# Altium footprint library Hydra_Ref_pcb.PcbLib: 353 footprints (part 3 of 23)
Each footprint in its own frame and in the unit in brackets; x right, y up, seen from the top. Pads: shape width x height; smd on the part's side, far side on the other; paste and mask are expansions set on the pad; w line width, h text height; cw(c..) or ccw(c..) is an arc to the next point about the centre after c.
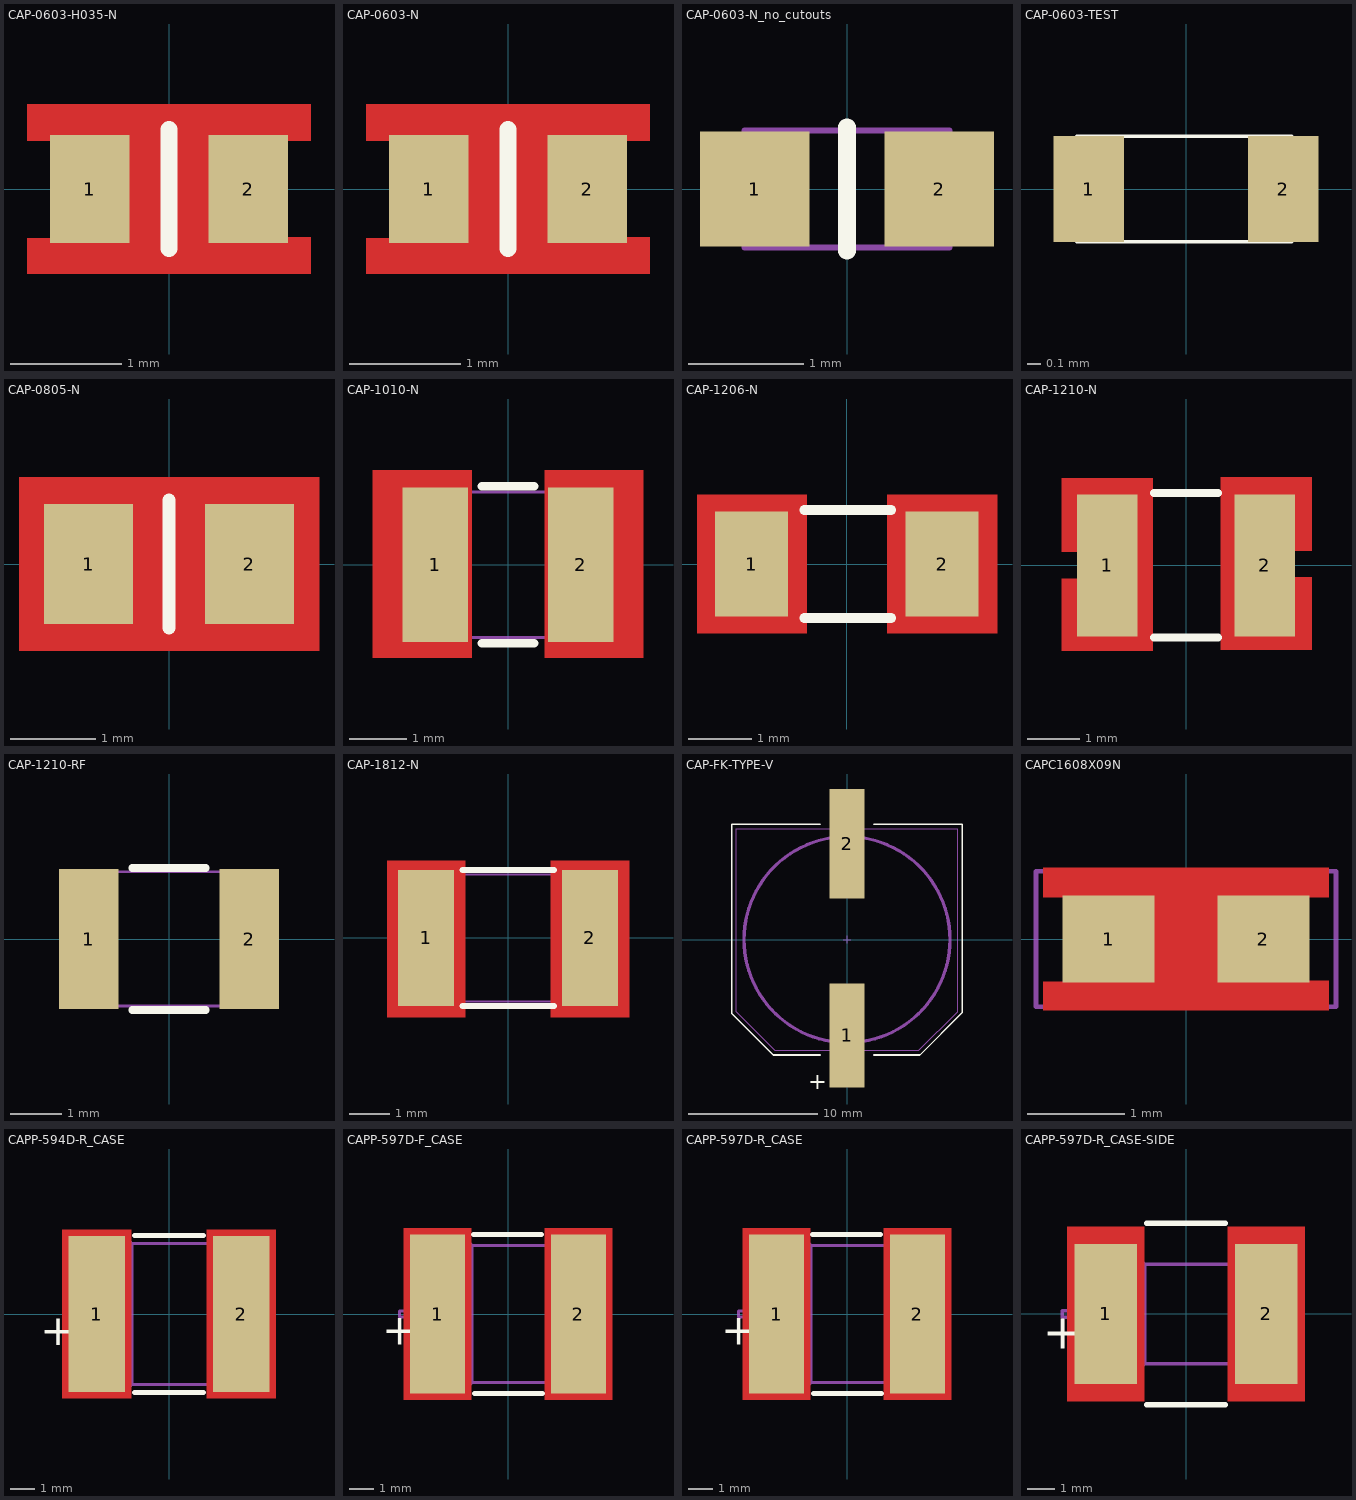
[diagram p2: the footprints below, top view; thin cyan lines are the x and y axes]

## CAP-0603-H035-N [mil] "Metric 1608"
height 35
pads (2):
  rect 28x38 smd: 1(-28,0) 2(28,0)
Top Layer:
  pour cut-out: -50,30 50,30 50,17 42,17 42,-17 50,-17 50,-30 -50,-30 -50,-17.33 -42,-17.33 -42,17 -50,17
Top Overlay:
  lines w6: 0,-21 0,21
Top Solder:
  pour cut-out: -53,30 53,30 53,-30 -53,-30
9 Top Assy:
  lines w2: -34,-19 34,-19 34,19 -34,19 -34,-19
  text ".Designator" at -25,-10 h16
3D body: height 35.43, standoff 0, extent 19.68,-17.72 33.46,17.72
3D body: height 35.43, standoff 0, extent -33.46,-17.72 -19.69,17.72
3D body: height 35.43, standoff 0, extent -19.69,-17.72 19.68,17.72

## CAP-0603-N [mil] "Metric 1608"
height 65
pads (2):
  rect 28x38 smd: 1(-28,0) 2(28,0)
Top Layer:
  pour cut-out: -50,30 50,30 50,17 42,17 42,-17 50,-17 50,-30 -50,-30 -50,-17.33 -42,-17.33 -42,17 -50,17
Top Overlay:
  lines w6: 0,-21 0,21
Top Solder:
  pour cut-out: -53,30 53,30 53,-30 -53,-30
9 Top Assy:
  lines w2: -34,-19 -34,19 34,19 34,-19 -34,-19
  text ".Designator" at -25,-10 h16
3D body: height 38, standoff 0.39, extent -32,-17 32,17

## CAP-0603-N_no_cutouts [mm] "Metric 1608"
height 1.651
pads (2):
  rect 0.95x1 smd: 1(-0.8,0) 2(0.8,0)
Top Overlay:
  lines w0.152: 0,-0.533 0,0.533
9 Top Assy:
  lines w0.051: -0.889,-0.508 -0.889,0.508 0.889,0.508 0.889,-0.508 -0.889,-0.508
  text ".Designator" at -0.635,-0.254 h0.41
3D body: height 1.65, standoff 0, extent -0.888,-0.507 0.888,0.507

## CAP-0603-TEST [mil]
pads (2):
  rect 20x30 smd: 1(-27.5,0) 2(27.5,0)
Top Overlay:
  lines w1: -31,-15 30,-15 30,15 -31,15 -31,-15

## CAP-0805-N [mil] "METRIC 2013"
height 57.09
pads (2):
  rect 41x55 smd: 1(-37,0) 2(37,0)
Top Layer:
  pour cut-out: -69,40 69,40 69,-40 -69,-40
Top Overlay:
  lines w6: 0,-29.53 0,29.53
9 Top Assy:
  lines w2: -42,-27 -42,27 42,27 42,-27 -42,-27
  text ".Designator" at -35,-10 h20
3D body: height 57.09, standoff 0, extent -42,-27 42,27

## CAP-1010-N [mm] "METRIC 3225"
height 1.016
pads (2):
  rect 1.15x2.7 smd: 1(-1.27,0) 2(1.27,0)
Top Layer:
  pour cut-out: 0.638,1.651 2.365,1.651 2.365,-1.626 0.638,-1.626
  pour cut-out: -2.362,1.651 -0.635,1.651 -0.635,-1.626 -2.362,-1.626
Top Overlay:
  lines w0.152: -0.457,-1.372 0.457,-1.372 ; -0.457,1.372 0.457,1.372
9 Top Assy:
  lines w0.051: -1.27,-1.27 1.27,-1.27 1.27,1.27 -1.27,1.27 -1.27,-1.27
  text ".Designator" at -0.889,-0.254 h0.51
3D body: height 1.02, standoff 0.01, extent -1.27,-1.27 1.27,1.27

## CAP-1206-N [mm] "METRIC 3225"
height 1.7
pads (2):
  rect 1.15x1.65 smd: 1(-1.5,0) 2(1.5,0)
Top Layer:
  pour cut-out: -2.362,1.092 -0.635,1.092 -0.635,-1.092 -2.362,-1.092
  pour cut-out: 0.638,1.092 2.365,1.092 2.365,-1.092 0.638,-1.092
Top Overlay:
  lines w0.152: -0.67,-0.85 0.7,-0.85 ; -0.67,0.85 0.7,0.85
9 Top Assy:
  lines w0.051: -1.7,-0.8 -1.7,0.8 1.7,0.8 1.7,-0.8 -1.7,-0.8
  text ".Designator" at -1.5,-0.4 h0.85
3D body: height 1.7, standoff 0, extent -1.699,-0.799 1.699,0.799

## CAP-1210-N [mm] "METRIC 3225"
height 2.79
pads (2):
  rect 1.15x2.7 smd: 1(-1.5,0) 2(1.5,0)
Top Layer:
  pour cut-out: 2.386,1.676 0.659,1.676 0.659,-1.6 2.386,-1.6 2.386,-0.229 2.031,-0.229 2.031,0.279 2.386,0.279
  pour cut-out: -2.362,1.651 -0.635,1.651 -0.635,-1.626 -2.362,-1.626 -2.362,-0.254 -2.007,-0.254 -2.007,0.254 -2.362,0.254
Top Overlay:
  lines w0.152: -0.61,-1.372 0.61,-1.372 ; -0.61,1.372 0.61,1.372
9 Top Assy:
  lines w0.051: -1.7,-1.35 -1.7,1.35 1.7,1.35 1.7,-1.35 -1.7,-1.35
  text ".Designator" at -1.5,-0.4 h0.81
3D body: height 2.8, standoff 0.01, extent -1.7,-1.35 1.7,1.35

## CAP-1210-RF [mm]
height 2.8
pads (2):
  rect 1.15x2.7 smd: 1(-1.549,0) 2(1.549,0)
Top Overlay:
  lines w0.152: -0.711,-1.372 0.711,-1.372 ; -0.711,1.372 0.711,1.372
9 Top Assy:
  lines w0.051: -1.7,-1.295 -1.7,1.3 1.7,1.3 1.7,-1.295 -1.7,-1.295
  text ".Designator" at -1.55,-0.4 h0.89
3D body: height 2.8, standoff 0, extent -1.699,-1.295 1.7,1.3

## CAP-1812-N [mm] "METRIC 4532"
height 2.7
pads (2):
  rect 1.4x3.4 smd: 1(-2.05,0) 2(2.04,0)
Top Layer:
  pour cut-out: 1.067,1.93 3.023,1.93 3.023,-1.981 1.067,-1.981
  pour cut-out: -3.023,1.93 -1.067,1.93 -1.067,-1.981 -3.023,-1.981
Top Overlay:
  lines w0.152: -1.143,-1.7 1.143,-1.7 ; -1.143,1.7 1.143,1.7
9 Top Assy:
  lines w0.051: -2.54,-1.587 -2.54,1.587 2.54,1.587 2.54,-1.587 -2.54,-1.587
  text ".Designator" at -2.286,-0.635 h1.27
3D body: height 2.7, standoff 0, extent -2.539,-1.587 2.539,1.587

## CAP-FK-TYPE-V [mm] "CAP-FK-TYPE-V"
height 17
pads (2):
  rect 2.7x8.1 smd: 1(0,-7.45)
  rect 2.7x8.5 smd: 2(0,7.45)
Top Overlay:
  lines w0.127: -2.083,-8.966 -5.74,-8.966 -8.941,-5.766 -8.941,8.966 -2.083,8.966 ; 2.083,-8.966 5.664,-8.966 8.941,-5.69 8.941,8.966 ; 2.083,8.966 8.915,8.966
  text "+" at -2.997,-11.608 h1.27
9 Top Assy:
  circle w0.254: c0,0 r8
  lines w0.051: -8.6,8.6 -8.6,-5.624 -5.613,-8.611 5.588,-8.611 8.593,-5.606 ; -8.585,8.6 8.6,8.6 8.6,-5.606
  lines w0.076: -0.3,0 0.3,0 ; 0,-0.3 0,0.3
  text ".Designator" at -2.134,-0.483 h1
  text "+" at -2.997,-10.541 h1.27
3D body: height 2.54, standoff 0, extent -8.6,-8.611 8.6,8.6
3D body: height 16.5, standoff 0.1, extent -8.001,-8.001 7.976,8.001

## CAPC1608X09N [mm] "Chip Capacitor, 2-Leads, Body 1.60x0.80mm, IPC Medium Density"
height 0.9
pads (2):
  rect 0.95x0.9 smd: 1(-0.8,0) 2(0.8,0)
Top Layer:
  pour cut-out: -1.473,0.737 1.473,0.737 1.473,0.432 1.27,0.432 1.27,-0.432 1.473,-0.432 1.473,-0.737 -1.473,-0.737 -1.473,-0.44 -1.27,-0.44 -1.27,0.432 -1.473,0.432
9 Top Assy:
  lines w0.051: -0.85,-0.45 -0.85,0.45 0.85,0.45 0.85,-0.45 -0.85,-0.45
  text ".Designator" at -0.711,-0.178 h0.38
15 Top Optical Placement:
  lines w0.051: -1.55,-0.7 -1.55,0.7 1.55,0.7 1.55,-0.7 -1.55,-0.7
  lines w0.1: -0.45,0 0.45,0 ; 0,-0.45 0,0.45
3D body: height 0.9, standoff 0, extent -0.5,-0.45 0.5,0.45
3D body: height 0.9, standoff 0, extent -0.85,-0.45 -0.5,0.45
3D body: height 0.9, standoff 0, extent 0.5,-0.45 0.85,0.45

## CAPP-594D-R_CASE [mil] "TANT CHIP CAP .283x.235x.148 R CASE CODE VISHAY"
height 150
pads (2):
  rect 90x248 smd: 1(-115,0) 2(115,0)
Top Layer:
  pour cut-out: 170,134 60,134 60,-134 170,-134
  pour cut-out: -60,134 -170,134 -170,-134 -60,-134
Top Overlay:
  lines w8: -55,-125 55,-125 ; -55,125 55,125
  text "+" at -205,-50 h50
9 Top Assy:
  lines w5: 122.05,106.3 ccw(c110.24,106.3) 110.24,118.11 76.77,118.11 ccw(c76.77,108.61) 70.05,115.33 66.93,112.2 ; 122.05,108.27 122.05,-108.27 cw(c112.2,-108.27) 112.2,-118.11 78.74,-118.11 cw(c78.74,-103.85) 68.66,-113.93 66.93,-112.2 ; -86.61,118.11 ccw(c-86.61,118.11) -86.61,118.11 ; -86.61,118.11 -70.87,118.11 cw(c-70.87,103.85) -60.78,113.93 -59.06,112.2 ; -86.61,118.11 -87.22,118.11 ccw(c-87.22,110.83) -92.37,115.98 -121.73,5 -161.42,5 -161.42,-5 -121.19,-5 -94.49,-114.17 -93.34,-115.33 ccw(c-86.61,-108.61) -86.61,-118.11 -70.87,-118.11 ccw(c-70.87,-103.85) -60.78,-113.93 -59.06,-112.2 ; -59.06,-112.2 66.93,-112.2 ; -59.06,-112.2 -59.06,112.2 ; -59.06,112.2 66.93,112.2 ; 66.93,-112.2 66.93,112.2
  text "+" at -163.39,9.84 h50
  text ".Designator" at 31.5,-98.43 h55
3D body: height 150, standoff 0, extent -122,-124 122,124
3D body: height 94.84, standoff 55, extent -161,-19.96 -122,19.96

## CAPP-597D-F_CASE [mil] "TANT CHIP CAP .299x.238x.201 F CASE CODE VISHAY"
height 201
pads (2):
  rect 90x260 smd: 1(-115,0) 2(115,0)
Top Layer:
  pour cut-out: 170,140 60,140 60,-140 170,-140
  pour cut-out: -60,140 -170,140 -170,-140 -60,-140
Top Overlay:
  lines w8: -56.82,130 55,130 ; -55,-130 56.82,-130
  text "+" at -205,-50 h50
9 Top Assy:
  lines w5: -122.05,-5 -177.17,-5 -177.17,5 -122.05,5 ; 122.05,106.3 ccw(c110.24,106.3) 110.24,118.11 76.77,118.11 ccw(c76.77,108.61) 70.05,115.33 66.93,112.2 ; 122.05,108.27 122.05,-108.27 cw(c112.2,-108.27) 112.2,-118.11 76.77,-118.11 cw(c76.77,-108.61) 70.05,-115.33 66.93,-112.2 ; -86.61,118.11 ccw(c-86.61,118.11) -86.61,118.11 ; -86.61,118.11 -87.22,118.11 ccw(c-87.22,110.83) -92.37,115.98 -122.05,86.3 -122.05,-86.61 -94.49,-114.17 -93.34,-115.33 ccw(c-86.61,-108.61) -86.61,-118.11 -68.9,-118.11 ccw(c-68.9,-108.61) -62.18,-115.33 -59.06,-112.2 ; -86.61,118.11 -68.9,118.11 cw(c-68.9,108.61) -62.18,115.33 -59.06,112.2 ; -59.06,-112.2 66.93,-112.2 ; -59.06,-112.2 -59.06,112.2 ; -59.06,112.2 66.93,112.2 ; 66.93,-112.2 66.93,112.2
  text ".Designator" at 31.5,-96.46 h55
  text "+" at -163.39,9.84 h50
3D body: height 165.92, standoff 146, extent -177.05,-10.14 -122.05,9.82
3D body: height 64.92, standoff 45, extent -177,-9.95 -122,10.01
3D body: height 201, standoff 0, extent -122,-127 -67,127
3D body: height 197, standoff 4, extent -67,-123 67,123
3D body: height 201, standoff 0, extent 67,-127 122,127

## CAPP-597D-R_CASE [mil] "TANT CHIP CAP .299x.238x.160\" R CASE CODE VISHAY"
height 160
pads (2):
  rect 90x260 smd: 1(-115,0) 2(115,0)
Top Layer:
  pour cut-out: -60,140 -170,140 -170,-140 -60,-140
  pour cut-out: 170,140 60,140 60,-140 170,-140
Top Overlay:
  lines w8: -56.82,130 55,130 ; -55,-130 56.82,-130
  text "+" at -205,-50 h50
9 Top Assy:
  lines w5: -122.05,-5 -177.17,-5 -177.17,5 -122.05,5 ; 122.05,106.3 ccw(c110.24,106.3) 110.24,118.11 76.77,118.11 ccw(c76.77,108.61) 70.05,115.33 66.93,112.2 ; 122.05,108.27 122.05,-108.27 cw(c112.2,-108.27) 112.2,-118.11 76.77,-118.11 cw(c76.77,-108.61) 70.05,-115.33 66.93,-112.2 ; -86.61,118.11 ccw(c-86.61,118.11) -86.61,118.11 ; -86.61,118.11 -87.22,118.11 ccw(c-87.22,110.83) -92.37,115.98 -122.05,86.3 -122.05,-86.61 -94.49,-114.17 -93.34,-115.33 ccw(c-86.61,-108.61) -86.61,-118.11 -68.9,-118.11 ccw(c-68.9,-108.61) -62.18,-115.33 -59.06,-112.2 ; -86.61,118.11 -68.9,118.11 cw(c-68.9,108.61) -62.18,115.33 -59.06,112.2 ; -59.06,-112.2 66.93,-112.2 ; -59.06,-112.2 -59.06,112.2 ; -59.06,112.2 66.93,112.2 ; 66.93,-112.2 66.93,112.2
  text ".Designator" at 31.5,-96.46 h55
  text "+" at -163.39,9.84 h50
3D body: height 157.48, standoff 50, extent -205,-19.92 -175,19.92
3D body: height 160, standoff 0, extent -175,-145 175,145

## CAPP-597D-R_CASE-SIDE [mil] "TANT CHIP CAP .299x.238x.160\" R CASE CODE VISHAY"
height 160
pads (2):
  rect 90x200 smd: 1(-115,0) 2(115,0)
Top Layer:
  pour cut-out: -60,125 -170,125 -170,-125 -60,-125
  pour cut-out: 170,125 60,125 60,-125 170,-125
Top Overlay:
  lines w8: -56,-130 56,-130 ; -56,129.99 56,129.99
  text "+" at -205,-50 h50
9 Top Assy:
  lines w5: -122.05,-5 -177.17,-5 -177.17,5 -122.05,5 ; -86.61,76.91 ccw(c-86.61,76.91) -86.61,76.91 ; -86.61,76.91 -87.22,76.91 ccw(c-87.22,69.63) -92.37,74.77 -122.05,45.09 -122.05,-45.41 -94.49,-72.97 -93.34,-74.12 ccw(c-86.61,-67.4) -86.61,-76.91 -68.9,-76.91 ccw(c-68.9,-67.4) -62.18,-74.12 -59.06,-71 ; -86.61,76.91 -68.9,76.91 cw(c-68.9,67.4) -62.18,74.12 -59.06,71 ; -59.06,-71 66.93,-71 ; -59.06,-71 -59.06,71 ; -59.06,71 66.93,71 ; 66.93,-71 66.93,71 ; 66.93,-71 70.05,-74.12 ccw(c76.77,-67.4) 76.77,-76.91 112.2,-76.91 ccw(c112.2,-67.06) 122.05,-67.06 122.05,65.09 ccw(c110.24,65.09) 110.24,76.91 76.77,76.91 ccw(c76.77,67.4) 70.05,74.12 66.93,71
  text ".Designator" at 31.5,-96.46 h55
  text "+" at -163.39,9.84 h50
3D body: height 157.48, standoff 50, extent -205,-19.92 -175,19.92
3D body: height 160, standoff 0, extent -175,-115 175,115